# Altium footprint library CONN_HDR_2.54MM_RA.PcbLib: 63 footprints (part 4 of 5)
Each footprint in its own frame and in the unit in brackets; x right, y up, seen from the top. Pads: shape width x height; smd on the part's side, far side on the other; paste and mask are expansions set on the pad; w line width, h text height; cw(c..) or ccw(c..) is an arc to the next point about the centre after c.
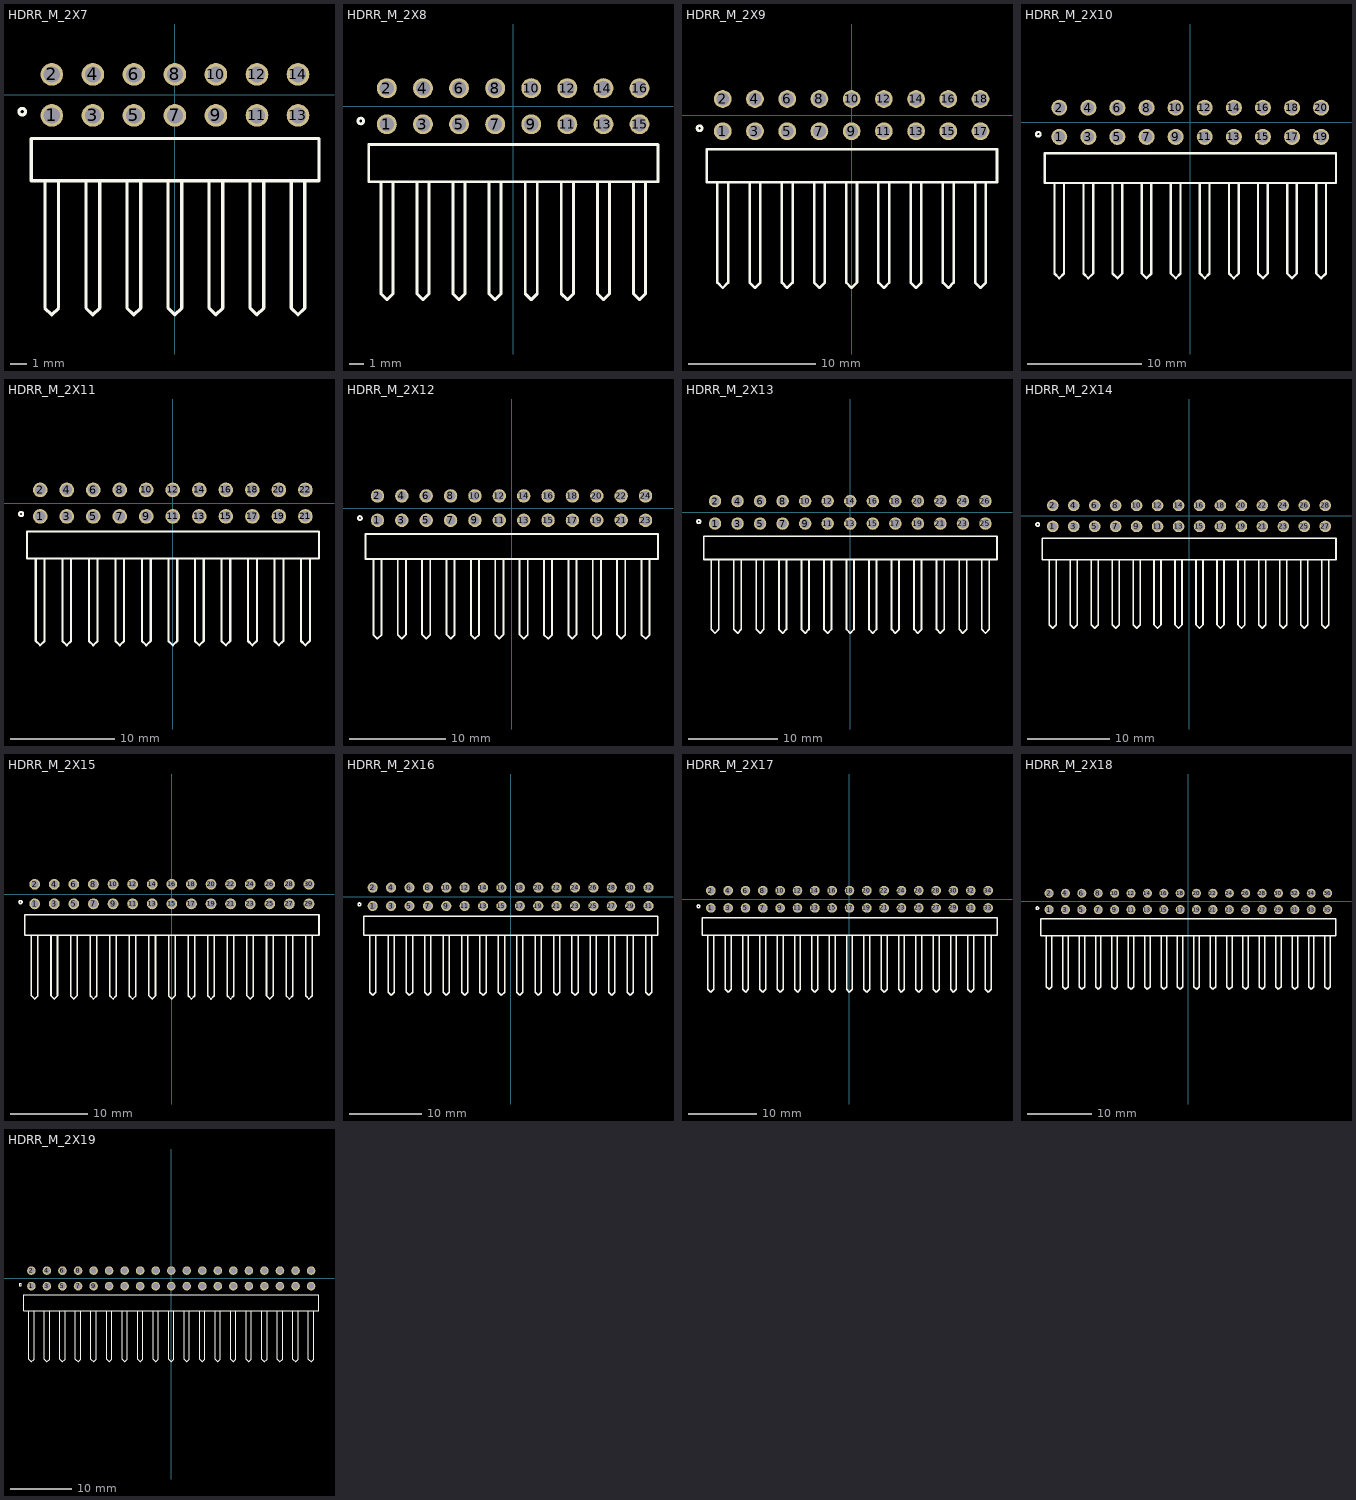
[diagram p3: the footprints below, top view; thin cyan lines are the x and y axes]

## HDRR_M_2X7 [mm] "Connector; Header; 7x2 Position"
height 7
pads (14):
  round 1.4 / inner round 1.4 / far side oval 1.4x2.2 hole 1: 1(-7.62,-1.27) 2(-7.62,1.27) 3(-5.08,-1.27) 4(-5.08,1.27) 5(-2.54,-1.27) 6(-2.54,1.27) 7(0,-1.27) 8(0,1.27) 9(2.54,-1.27) 10(2.54,1.27) 11(5.08,-1.27) 12(5.08,1.27) 13(7.62,-1.27) 14(7.62,1.27)
Top Overlay:
  circle w0.2: c-9.45,-1.04 r0.2
  lines w0.2: -8.043,-5.31 -8.043,-13.197 -7.62,-13.62 -7.197,-13.197 -7.197,-5.31 ; -6.35,-5.31 -3.78,-5.31 ; -6.35,-2.7 -3.78,-2.7 ; -6.32,-5.31 -8.89,-5.31 -8.89,-2.7 -6.32,-2.7 ; -5.503,-5.31 -5.503,-13.197 -5.08,-13.62 -4.657,-13.197 -4.657,-5.31 ; -3.81,-5.31 -1.24,-5.31 ; -3.81,-2.7 -1.24,-2.7 ; -2.963,-5.31 -2.963,-13.197 -2.54,-13.62 -2.117,-13.197 -2.117,-5.31 ; -1.27,-5.31 1.3,-5.31 ; -1.27,-2.7 1.3,-2.7 ; -0.423,-5.31 -0.423,-13.197 0,-13.62 0.423,-13.197 0.423,-5.31 ; 1.27,-5.31 3.84,-5.31 ; 1.27,-2.7 3.84,-2.7 ; 2.117,-5.31 2.117,-13.197 2.54,-13.62 2.963,-13.197 2.963,-5.31 ; 3.81,-5.31 6.38,-5.31 ; 3.81,-2.7 6.38,-2.7 ; 4.657,-5.31 4.657,-13.197 5.08,-13.62 5.503,-13.197 5.503,-5.31 ; 6.35,-5.31 8.92,-5.31 8.92,-2.7 6.35,-2.7 ; 7.197,-5.31 7.197,-13.197 7.62,-13.62 8.043,-13.197 8.043,-5.31
3D body "2x1 Male Pin Header Angle.STEP": height 5.04, standoff -2.96, extent -1.275,-13.34 1.27,1.56
3D body "2x1 Male Pin Header Angle.STEP": height 5.04, standoff -2.96, extent -3.815,-13.34 -1.27,1.56
3D body "2x1 Male Pin Header Angle.STEP": height 5.04, standoff -2.96, extent -8.895,-13.34 -6.35,1.56
3D body "2x1 Male Pin Header Angle.STEP": height 5.04, standoff -2.96, extent -6.355,-13.34 -3.81,1.56
3D body "2x1 Male Pin Header Angle.STEP": height 5.04, standoff -2.96, extent 1.265,-13.34 3.81,1.56
3D body "2x1 Male Pin Header Angle.STEP": height 5.04, standoff -2.96, extent 3.805,-13.34 6.35,1.56
3D body "2x1 Male Pin Header Angle.STEP": height 5.04, standoff -2.96, extent 6.345,-13.34 8.89,1.56

## HDRR_M_2X8 [mm] "Connector; Header; 8x2 Position"
height 7
pads (16):
  round 1.4 / inner round 1.4 / far side oval 1.4x2.2 hole 1: 1(-8.89,-1.27) 2(-8.89,1.27) 3(-6.35,-1.27) 4(-6.35,1.27) 5(-3.81,-1.27) 6(-3.81,1.27) 7(-1.27,-1.27) 8(-1.27,1.27) 9(1.27,-1.27) 10(1.27,1.27) 11(3.81,-1.27) 12(3.81,1.27) 13(6.35,-1.27) 14(6.35,1.27) 15(8.89,-1.27) 16(8.89,1.27)
Top Overlay:
  circle w0.2: c-10.72,-1.04 r0.2
  lines w0.2: -9.313,-5.31 -9.313,-13.197 -8.89,-13.62 -8.467,-13.197 -8.467,-5.31 ; -7.62,-5.31 -5.05,-5.31 ; -7.62,-2.7 -5.05,-2.7 ; -7.59,-5.31 -10.16,-5.31 -10.16,-2.7 -7.59,-2.7 ; -6.773,-5.31 -6.773,-13.197 -6.35,-13.62 -5.927,-13.197 -5.927,-5.31 ; -5.08,-5.31 -2.51,-5.31 ; -5.08,-2.7 -2.51,-2.7 ; -4.233,-5.31 -4.233,-13.197 -3.81,-13.62 -3.387,-13.197 -3.387,-5.31 ; -2.54,-5.31 0.03,-5.31 ; -2.54,-2.7 0.03,-2.7 ; -1.693,-5.31 -1.693,-13.197 -1.27,-13.62 -0.847,-13.197 -0.847,-5.31 ; 0,-5.31 2.57,-5.31 ; 0,-2.7 2.57,-2.7 ; 0.847,-5.31 0.847,-13.197 1.27,-13.62 1.693,-13.197 1.693,-5.31 ; 2.54,-5.31 5.11,-5.31 ; 2.54,-2.7 5.11,-2.7 ; 3.387,-5.31 3.387,-13.197 3.81,-13.62 4.233,-13.197 4.233,-5.31 ; 5.08,-5.31 7.65,-5.31 ; 5.08,-2.7 7.65,-2.7 ; 5.927,-5.31 5.927,-13.197 6.35,-13.62 6.773,-13.197 6.773,-5.31 ; 7.62,-5.31 10.19,-5.31 10.19,-2.7 7.62,-2.7 ; 8.467,-5.31 8.467,-13.197 8.89,-13.62 9.313,-13.197 9.313,-5.31
3D body "2x1 Male Pin Header Angle.STEP": height 5.04, standoff -2.96, extent -10.165,-13.34 -7.62,1.56
3D body "2x1 Male Pin Header Angle.STEP": height 5.04, standoff -2.96, extent -7.625,-13.34 -5.08,1.56
3D body "2x1 Male Pin Header Angle.STEP": height 5.04, standoff -2.96, extent -5.085,-13.34 -2.54,1.56
3D body "2x1 Male Pin Header Angle.STEP": height 5.04, standoff -2.96, extent -2.545,-13.34 0,1.56
3D body "2x1 Male Pin Header Angle.STEP": height 5.04, standoff -2.96, extent -0.005,-13.34 2.54,1.56
3D body "2x1 Male Pin Header Angle.STEP": height 5.04, standoff -2.96, extent 2.535,-13.34 5.08,1.56
3D body "2x1 Male Pin Header Angle.STEP": height 5.04, standoff -2.96, extent 5.075,-13.34 7.62,1.56
3D body "2x1 Male Pin Header Angle.STEP": height 5.04, standoff -2.96, extent 7.615,-13.34 10.16,1.56

## HDRR_M_2X9 [mm] "Connector; Header; 9x2 Position"
height 7
pads (18):
  round 1.4 / inner round 1.4 / far side oval 1.4x2.2 hole 1: 1(-10.16,-1.27) 2(-10.16,1.27) 3(-7.62,-1.27) 4(-7.62,1.27) 5(-5.08,-1.27) 6(-5.08,1.27) 7(-2.54,-1.27) 8(-2.54,1.27) 9(0,-1.27) 10(0,1.27) 11(2.54,-1.27) 12(2.54,1.27) 13(5.08,-1.27) 14(5.08,1.27) 15(7.62,-1.27) 16(7.62,1.27) 17(10.16,-1.27) 18(10.16,1.27)
Top Overlay:
  circle w0.2: c-11.99,-1.04 r0.2
  lines w0.2: -10.583,-5.31 -10.583,-13.197 -10.16,-13.62 -9.737,-13.197 -9.737,-5.31 ; -8.89,-5.31 -6.32,-5.31 ; -8.89,-2.7 -6.32,-2.7 ; -8.86,-5.31 -11.43,-5.31 -11.43,-2.7 -8.86,-2.7 ; -8.043,-5.31 -8.043,-13.197 -7.62,-13.62 -7.197,-13.197 -7.197,-5.31 ; -6.35,-5.31 -3.78,-5.31 ; -6.35,-2.7 -3.78,-2.7 ; -5.503,-5.31 -5.503,-13.197 -5.08,-13.62 -4.657,-13.197 -4.657,-5.31 ; -3.81,-5.31 -1.24,-5.31 ; -3.81,-2.7 -1.24,-2.7 ; -2.963,-5.31 -2.963,-13.197 -2.54,-13.62 -2.117,-13.197 -2.117,-5.31 ; -1.27,-5.31 1.3,-5.31 ; -1.27,-2.7 1.3,-2.7 ; -0.423,-5.31 -0.423,-13.197 0,-13.62 0.423,-13.197 0.423,-5.31 ; 1.27,-5.31 3.84,-5.31 ; 1.27,-2.7 3.84,-2.7 ; 2.117,-5.31 2.117,-13.197 2.54,-13.62 2.963,-13.197 2.963,-5.31 ; 3.81,-5.31 6.38,-5.31 ; 3.81,-2.7 6.38,-2.7 ; 4.657,-5.31 4.657,-13.197 5.08,-13.62 5.503,-13.197 5.503,-5.31 ; 6.35,-5.31 8.92,-5.31 ; 6.35,-2.7 8.92,-2.7 ; 7.197,-5.31 7.197,-13.197 7.62,-13.62 8.043,-13.197 8.043,-5.31 ; 8.89,-5.31 11.46,-5.31 11.46,-2.7 8.89,-2.7 ; 9.737,-5.31 9.737,-13.197 10.16,-13.62 10.583,-13.197 10.583,-5.31
3D body "2x1 Male Pin Header Angle.STEP": height 5.04, standoff -2.96, extent 8.885,-13.34 11.43,1.56
3D body "2x1 Male Pin Header Angle.STEP": height 5.04, standoff -2.96, extent 6.345,-13.34 8.89,1.56
3D body "2x1 Male Pin Header Angle.STEP": height 5.04, standoff -2.96, extent 3.805,-13.34 6.35,1.56
3D body "2x1 Male Pin Header Angle.STEP": height 5.04, standoff -2.96, extent 1.265,-13.34 3.81,1.56
3D body "2x1 Male Pin Header Angle.STEP": height 5.04, standoff -2.96, extent -1.275,-13.34 1.27,1.56
3D body "2x1 Male Pin Header Angle.STEP": height 5.04, standoff -2.96, extent -3.815,-13.34 -1.27,1.56
3D body "2x1 Male Pin Header Angle.STEP": height 5.04, standoff -2.96, extent -6.355,-13.34 -3.81,1.56
3D body "2x1 Male Pin Header Angle.STEP": height 5.04, standoff -2.96, extent -8.895,-13.34 -6.35,1.56
3D body "2x1 Male Pin Header Angle.STEP": height 5.04, standoff -2.96, extent -11.435,-13.34 -8.89,1.56

## HDRR_M_2X10 [mm] "Connector; Header; 10x2 Position"
height 7
pads (20):
  round 1.4 / inner round 1.4 / far side oval 1.4x2.2 hole 1: 1(-11.43,-1.27) 2(-11.43,1.27) 3(-8.89,-1.27) 4(-8.89,1.27) 5(-6.35,-1.27) 6(-6.35,1.27) 7(-3.81,-1.27) 8(-3.81,1.27) 9(-1.27,-1.27) 10(-1.27,1.27) 11(1.27,-1.27) 12(1.27,1.27) 13(3.81,-1.27) 14(3.81,1.27) 15(6.35,-1.27) 16(6.35,1.27) 17(8.89,-1.27) 18(8.89,1.27) 19(11.43,-1.27) 20(11.43,1.27)
Top Overlay:
  circle w0.2: c-13.26,-1.04 r0.2
  lines w0.2: -11.853,-5.31 -11.853,-13.197 -11.43,-13.62 -11.007,-13.197 -11.007,-5.31 ; -10.16,-5.31 -7.59,-5.31 ; -10.16,-2.7 -7.59,-2.7 ; -10.13,-5.31 -12.7,-5.31 -12.7,-2.7 -10.13,-2.7 ; -9.313,-5.31 -9.313,-13.197 -8.89,-13.62 -8.467,-13.197 -8.467,-5.31 ; -7.62,-5.31 -5.05,-5.31 ; -7.62,-2.7 -5.05,-2.7 ; -6.773,-5.31 -6.773,-13.197 -6.35,-13.62 -5.927,-13.197 -5.927,-5.31 ; -5.08,-5.31 -2.51,-5.31 ; -5.08,-2.7 -2.51,-2.7 ; -4.233,-5.31 -4.233,-13.197 -3.81,-13.62 -3.387,-13.197 -3.387,-5.31 ; -2.54,-5.31 0.03,-5.31 ; -2.54,-2.7 0.03,-2.7 ; -1.693,-5.31 -1.693,-13.197 -1.27,-13.62 -0.847,-13.197 -0.847,-5.31 ; 0,-5.31 2.57,-5.31 ; 0,-2.7 2.57,-2.7 ; 0.847,-5.31 0.847,-13.197 1.27,-13.62 1.693,-13.197 1.693,-5.31 ; 2.54,-5.31 5.11,-5.31 ; 2.54,-2.7 5.11,-2.7 ; 3.387,-5.31 3.387,-13.197 3.81,-13.62 4.233,-13.197 4.233,-5.31 ; 5.08,-5.31 7.65,-5.31 ; 5.08,-2.7 7.65,-2.7 ; 5.927,-5.31 5.927,-13.197 6.35,-13.62 6.773,-13.197 6.773,-5.31 ; 7.62,-5.31 10.19,-5.31 ; 7.62,-2.7 10.19,-2.7 ; 8.467,-5.31 8.467,-13.197 8.89,-13.62 9.313,-13.197 9.313,-5.31 ; 10.16,-5.31 12.73,-5.31 12.73,-2.7 10.16,-2.7 ; 11.007,-5.31 11.007,-13.197 11.43,-13.62 11.853,-13.197 11.853,-5.31
3D body "2x1 Male Pin Header Angle.STEP": height 5.04, standoff -2.96, extent 10.155,-13.34 12.7,1.56
3D body "2x1 Male Pin Header Angle.STEP": height 5.04, standoff -2.96, extent 7.615,-13.34 10.16,1.56
3D body "2x1 Male Pin Header Angle.STEP": height 5.04, standoff -2.96, extent 5.075,-13.34 7.62,1.56
3D body "2x1 Male Pin Header Angle.STEP": height 5.04, standoff -2.96, extent 2.535,-13.34 5.08,1.56
3D body "2x1 Male Pin Header Angle.STEP": height 5.04, standoff -2.96, extent -0.005,-13.34 2.54,1.56
3D body "2x1 Male Pin Header Angle.STEP": height 5.04, standoff -2.96, extent -2.545,-13.34 0,1.56
3D body "2x1 Male Pin Header Angle.STEP": height 5.04, standoff -2.96, extent -5.085,-13.34 -2.54,1.56
3D body "2x1 Male Pin Header Angle.STEP": height 5.04, standoff -2.96, extent -7.625,-13.34 -5.08,1.56
3D body "2x1 Male Pin Header Angle.STEP": height 5.04, standoff -2.96, extent -10.165,-13.34 -7.62,1.56
3D body "2x1 Male Pin Header Angle.STEP": height 5.04, standoff -2.96, extent -12.705,-13.34 -10.16,1.56

## HDRR_M_2X11 [mm] "Connector; Header; 11x2 Position"
height 7
pads (22):
  round 1.4 / inner round 1.4 / far side oval 1.4x2.2 hole 1: 1(-12.7,-1.27) 2(-12.7,1.27) 3(-10.16,-1.27) 4(-10.16,1.27) 5(-7.62,-1.27) 6(-7.62,1.27) 7(-5.08,-1.27) 8(-5.08,1.27) 9(-2.54,-1.27) 10(-2.54,1.27) 11(0,-1.27) 12(0,1.27) 13(2.54,-1.27) 14(2.54,1.27) 15(5.08,-1.27) 16(5.08,1.27) 17(7.62,-1.27) 18(7.62,1.27) 19(10.16,-1.27) 20(10.16,1.27) 21(12.7,-1.27) 22(12.7,1.27)
Top Overlay:
  circle w0.2: c-14.53,-1.04 r0.2
  lines w0.2: -13.123,-5.31 -13.123,-13.197 -12.7,-13.62 -12.277,-13.197 -12.277,-5.31 ; -11.43,-5.31 -8.86,-5.31 ; -11.43,-2.7 -8.86,-2.7 ; -11.4,-5.31 -13.97,-5.31 -13.97,-2.7 -11.4,-2.7 ; -10.583,-5.31 -10.583,-13.197 -10.16,-13.62 -9.737,-13.197 -9.737,-5.31 ; -8.89,-5.31 -6.32,-5.31 ; -8.89,-2.7 -6.32,-2.7 ; -8.043,-5.31 -8.043,-13.197 -7.62,-13.62 -7.197,-13.197 -7.197,-5.31 ; -6.35,-5.31 -3.78,-5.31 ; -6.35,-2.7 -3.78,-2.7 ; -5.503,-5.31 -5.503,-13.197 -5.08,-13.62 -4.657,-13.197 -4.657,-5.31 ; -3.81,-5.31 -1.24,-5.31 ; -3.81,-2.7 -1.24,-2.7 ; -2.963,-5.31 -2.963,-13.197 -2.54,-13.62 -2.117,-13.197 -2.117,-5.31 ; -1.27,-5.31 1.3,-5.31 ; -1.27,-2.7 1.3,-2.7 ; -0.423,-5.31 -0.423,-13.197 0,-13.62 0.423,-13.197 0.423,-5.31 ; 1.27,-5.31 3.84,-5.31 ; 1.27,-2.7 3.84,-2.7 ; 2.117,-5.31 2.117,-13.197 2.54,-13.62 2.963,-13.197 2.963,-5.31 ; 3.81,-5.31 6.38,-5.31 ; 3.81,-2.7 6.38,-2.7 ; 4.657,-5.31 4.657,-13.197 5.08,-13.62 5.503,-13.197 5.503,-5.31 ; 6.35,-5.31 8.92,-5.31 ; 6.35,-2.7 8.92,-2.7 ; 7.197,-5.31 7.197,-13.197 7.62,-13.62 8.043,-13.197 8.043,-5.31 ; 8.89,-5.31 11.46,-5.31 ; 8.89,-2.7 11.46,-2.7 ; 9.737,-5.31 9.737,-13.197 10.16,-13.62 10.583,-13.197 10.583,-5.31 ; 11.43,-5.31 14,-5.31 14,-2.7 11.43,-2.7 ; 12.277,-5.31 12.277,-13.197 12.7,-13.62 13.123,-13.197 13.123,-5.31
3D body "2x1 Male Pin Header Angle.STEP": height 5.04, standoff -2.96, extent -13.975,-13.34 -11.43,1.56
3D body "2x1 Male Pin Header Angle.STEP": height 5.04, standoff -2.96, extent -11.435,-13.34 -8.89,1.56
3D body "2x1 Male Pin Header Angle.STEP": height 5.04, standoff -2.96, extent -8.895,-13.34 -6.35,1.56
3D body "2x1 Male Pin Header Angle.STEP": height 5.04, standoff -2.96, extent -6.355,-13.34 -3.81,1.56
3D body "2x1 Male Pin Header Angle.STEP": height 5.04, standoff -2.96, extent -3.815,-13.34 -1.27,1.56
3D body "2x1 Male Pin Header Angle.STEP": height 5.04, standoff -2.96, extent -1.275,-13.34 1.27,1.56
3D body "2x1 Male Pin Header Angle.STEP": height 5.04, standoff -2.96, extent 1.265,-13.34 3.81,1.56
3D body "2x1 Male Pin Header Angle.STEP": height 5.04, standoff -2.96, extent 3.805,-13.34 6.35,1.56
3D body "2x1 Male Pin Header Angle.STEP": height 5.04, standoff -2.96, extent 6.345,-13.34 8.89,1.56
3D body "2x1 Male Pin Header Angle.STEP": height 5.04, standoff -2.96, extent 8.885,-13.34 11.43,1.56
3D body "2x1 Male Pin Header Angle.STEP": height 5.04, standoff -2.96, extent 11.425,-13.34 13.97,1.56

## HDRR_M_2X12 [mm] "Connector; Header; 12x2 Position"
height 7
pads (24):
  round 1.4 / inner round 1.4 / far side oval 1.4x2.2 hole 1: 1(-13.97,-1.27) 2(-13.97,1.27) 3(-11.43,-1.27) 4(-11.43,1.27) 5(-8.89,-1.27) 6(-8.89,1.27) 7(-6.35,-1.27) 8(-6.35,1.27) 9(-3.81,-1.27) 10(-3.81,1.27) 11(-1.27,-1.27) 12(-1.27,1.27) 13(1.27,-1.27) 14(1.27,1.27) 15(3.81,-1.27) 16(3.81,1.27) 17(6.35,-1.27) 18(6.35,1.27) 19(8.89,-1.27) 20(8.89,1.27) 21(11.43,-1.27) 22(11.43,1.27) 23(13.97,-1.27) 24(13.97,1.27)
Top Overlay:
  circle w0.2: c-15.8,-1.04 r0.2
  lines w0.2: -14.393,-5.31 -14.393,-13.197 -13.97,-13.62 -13.547,-13.197 -13.547,-5.31 ; -12.7,-5.31 -10.13,-5.31 ; -12.7,-2.7 -10.13,-2.7 ; -12.67,-5.31 -15.24,-5.31 -15.24,-2.7 -12.67,-2.7 ; -11.853,-5.31 -11.853,-13.197 -11.43,-13.62 -11.007,-13.197 -11.007,-5.31 ; -10.16,-5.31 -7.59,-5.31 ; -10.16,-2.7 -7.59,-2.7 ; -9.313,-5.31 -9.313,-13.197 -8.89,-13.62 -8.467,-13.197 -8.467,-5.31 ; -7.62,-5.31 -5.05,-5.31 ; -7.62,-2.7 -5.05,-2.7 ; -6.773,-5.31 -6.773,-13.197 -6.35,-13.62 -5.927,-13.197 -5.927,-5.31 ; -5.08,-5.31 -2.51,-5.31 ; -5.08,-2.7 -2.51,-2.7 ; -4.233,-5.31 -4.233,-13.197 -3.81,-13.62 -3.387,-13.197 -3.387,-5.31 ; -2.54,-5.31 0.03,-5.31 ; -2.54,-2.7 0.03,-2.7 ; -1.693,-5.31 -1.693,-13.197 -1.27,-13.62 -0.847,-13.197 -0.847,-5.31 ; 0,-5.31 2.57,-5.31 ; 0,-2.7 2.57,-2.7 ; 0.847,-5.31 0.847,-13.197 1.27,-13.62 1.693,-13.197 1.693,-5.31 ; 2.54,-5.31 5.11,-5.31 ; 2.54,-2.7 5.11,-2.7 ; 3.387,-5.31 3.387,-13.197 3.81,-13.62 4.233,-13.197 4.233,-5.31 ; 5.08,-5.31 7.65,-5.31 ; 5.08,-2.7 7.65,-2.7 ; 5.927,-5.31 5.927,-13.197 6.35,-13.62 6.773,-13.197 6.773,-5.31 ; 7.62,-5.31 10.19,-5.31 ; 7.62,-2.7 10.19,-2.7 ; 8.467,-5.31 8.467,-13.197 8.89,-13.62 9.313,-13.197 9.313,-5.31 ; 10.16,-5.31 12.73,-5.31 ; 10.16,-2.7 12.73,-2.7 ; 11.007,-5.31 11.007,-13.197 11.43,-13.62 11.853,-13.197 11.853,-5.31 ; 12.7,-5.31 15.27,-5.31 15.27,-2.7 12.7,-2.7 ; 13.547,-5.31 13.547,-13.197 13.97,-13.62 14.393,-13.197 14.393,-5.31
3D body "2x1 Male Pin Header Angle.STEP": height 5.04, standoff -2.96, extent -15.245,-13.34 -12.7,1.56
3D body "2x1 Male Pin Header Angle.STEP": height 5.04, standoff -2.96, extent -12.705,-13.34 -10.16,1.56
3D body "2x1 Male Pin Header Angle.STEP": height 5.04, standoff -2.96, extent -10.165,-13.34 -7.62,1.56
3D body "2x1 Male Pin Header Angle.STEP": height 5.04, standoff -2.96, extent -7.625,-13.34 -5.08,1.56
3D body "2x1 Male Pin Header Angle.STEP": height 5.04, standoff -2.96, extent -5.085,-13.34 -2.54,1.56
3D body "2x1 Male Pin Header Angle.STEP": height 5.04, standoff -2.96, extent -2.545,-13.34 0,1.56
3D body "2x1 Male Pin Header Angle.STEP": height 5.04, standoff -2.96, extent -0.005,-13.34 2.54,1.56
3D body "2x1 Male Pin Header Angle.STEP": height 5.04, standoff -2.96, extent 2.535,-13.34 5.08,1.56
3D body "2x1 Male Pin Header Angle.STEP": height 5.04, standoff -2.96, extent 5.075,-13.34 7.62,1.56
3D body "2x1 Male Pin Header Angle.STEP": height 5.04, standoff -2.96, extent 7.615,-13.34 10.16,1.56
3D body "2x1 Male Pin Header Angle.STEP": height 5.04, standoff -2.96, extent 10.155,-13.34 12.7,1.56
3D body "2x1 Male Pin Header Angle.STEP": height 5.04, standoff -2.96, extent 12.695,-13.34 15.24,1.56

## HDRR_M_2X13 [mm] "Connector; Header; 13x2 Position"
height 7
pads (26):
  round 1.4 / inner round 1.4 / far side oval 1.4x2.2 hole 1: 1(-15.24,-1.27) 2(-15.24,1.27) 3(-12.7,-1.27) 4(-12.7,1.27) 5(-10.16,-1.27) 6(-10.16,1.27) 7(-7.62,-1.27) 8(-7.62,1.27) 9(-5.08,-1.27) 10(-5.08,1.27) 11(-2.54,-1.27) 12(-2.54,1.27) 13(0,-1.27) 14(0,1.27) 15(2.54,-1.27) 16(2.54,1.27) 17(5.08,-1.27) 18(5.08,1.27) 19(7.62,-1.27) 20(7.62,1.27) 21(10.16,-1.27) 22(10.16,1.27) 23(12.7,-1.27) 24(12.7,1.27) 25(15.24,-1.27) 26(15.24,1.27)
Top Overlay:
  circle w0.2: c-17.07,-1.04 r0.2
  lines w0.2: -15.663,-5.31 -15.663,-13.197 -15.24,-13.62 -14.817,-13.197 -14.817,-5.31 ; -13.97,-5.31 -11.4,-5.31 ; -13.97,-2.7 -11.4,-2.7 ; -13.94,-5.31 -16.51,-5.31 -16.51,-2.7 -13.94,-2.7 ; -13.123,-5.31 -13.123,-13.197 -12.7,-13.62 -12.277,-13.197 -12.277,-5.31 ; -11.43,-5.31 -8.86,-5.31 ; -11.43,-2.7 -8.86,-2.7 ; -10.583,-5.31 -10.583,-13.197 -10.16,-13.62 -9.737,-13.197 -9.737,-5.31 ; -8.89,-5.31 -6.32,-5.31 ; -8.89,-2.7 -6.32,-2.7 ; -8.043,-5.31 -8.043,-13.197 -7.62,-13.62 -7.197,-13.197 -7.197,-5.31 ; -6.35,-5.31 -3.78,-5.31 ; -6.35,-2.7 -3.78,-2.7 ; -5.503,-5.31 -5.503,-13.197 -5.08,-13.62 -4.657,-13.197 -4.657,-5.31 ; -3.81,-5.31 -1.24,-5.31 ; -3.81,-2.7 -1.24,-2.7 ; -2.963,-5.31 -2.963,-13.197 -2.54,-13.62 -2.117,-13.197 -2.117,-5.31 ; -1.27,-5.31 1.3,-5.31 ; -1.27,-2.7 1.3,-2.7 ; -0.423,-5.31 -0.423,-13.197 0,-13.62 0.423,-13.197 0.423,-5.31 ; 1.27,-5.31 3.84,-5.31 ; 1.27,-2.7 3.84,-2.7 ; 2.117,-5.31 2.117,-13.197 2.54,-13.62 2.963,-13.197 2.963,-5.31 ; 3.81,-5.31 6.38,-5.31 ; 3.81,-2.7 6.38,-2.7 ; 4.657,-5.31 4.657,-13.197 5.08,-13.62 5.503,-13.197 5.503,-5.31 ; 6.35,-5.31 8.92,-5.31 ; 6.35,-2.7 8.92,-2.7 ; 7.197,-5.31 7.197,-13.197 7.62,-13.62 8.043,-13.197 8.043,-5.31 ; 8.89,-5.31 11.46,-5.31 ; 8.89,-2.7 11.46,-2.7 ; 9.737,-5.31 9.737,-13.197 10.16,-13.62 10.583,-13.197 10.583,-5.31 ; 11.43,-5.31 14,-5.31 ; 11.43,-2.7 14,-2.7 ; 12.277,-5.31 12.277,-13.197 12.7,-13.62 13.123,-13.197 13.123,-5.31 ; 13.97,-5.31 16.54,-5.31 16.54,-2.7 13.97,-2.7 ; 14.817,-5.31 14.817,-13.197 15.24,-13.62 15.663,-13.197 15.663,-5.31
3D body "2x1 Male Pin Header Angle.STEP": height 5.04, standoff -2.96, extent -16.515,-13.34 -13.97,1.56
3D body "2x1 Male Pin Header Angle.STEP": height 5.04, standoff -2.96, extent -13.975,-13.34 -11.43,1.56
3D body "2x1 Male Pin Header Angle.STEP": height 5.04, standoff -2.96, extent -11.435,-13.34 -8.89,1.56
3D body "2x1 Male Pin Header Angle.STEP": height 5.04, standoff -2.96, extent -8.895,-13.34 -6.35,1.56
3D body "2x1 Male Pin Header Angle.STEP": height 5.04, standoff -2.96, extent -6.355,-13.34 -3.81,1.56
3D body "2x1 Male Pin Header Angle.STEP": height 5.04, standoff -2.96, extent -3.815,-13.34 -1.27,1.56
3D body "2x1 Male Pin Header Angle.STEP": height 5.04, standoff -2.96, extent -1.275,-13.34 1.27,1.56
3D body "2x1 Male Pin Header Angle.STEP": height 5.04, standoff -2.96, extent 1.265,-13.34 3.81,1.56
3D body "2x1 Male Pin Header Angle.STEP": height 5.04, standoff -2.96, extent 3.805,-13.34 6.35,1.56
3D body "2x1 Male Pin Header Angle.STEP": height 5.04, standoff -2.96, extent 6.345,-13.34 8.89,1.56
3D body "2x1 Male Pin Header Angle.STEP": height 5.04, standoff -2.96, extent 8.885,-13.34 11.43,1.56
3D body "2x1 Male Pin Header Angle.STEP": height 5.04, standoff -2.96, extent 11.425,-13.34 13.97,1.56
3D body "2x1 Male Pin Header Angle.STEP": height 5.04, standoff -2.96, extent 13.965,-13.34 16.51,1.56
